# Altium footprint library PcbLib_jp.PcbLib: 178 footprints (part 4 of 12)
Each footprint in its own frame and in the unit in brackets; x right, y up, seen from the top. Pads: shape width x height; smd on the part's side, far side on the other; paste and mask are expansions set on the pad; w line width, h text height; cw(c..) or ccw(c..) is an arc to the next point about the centre after c.
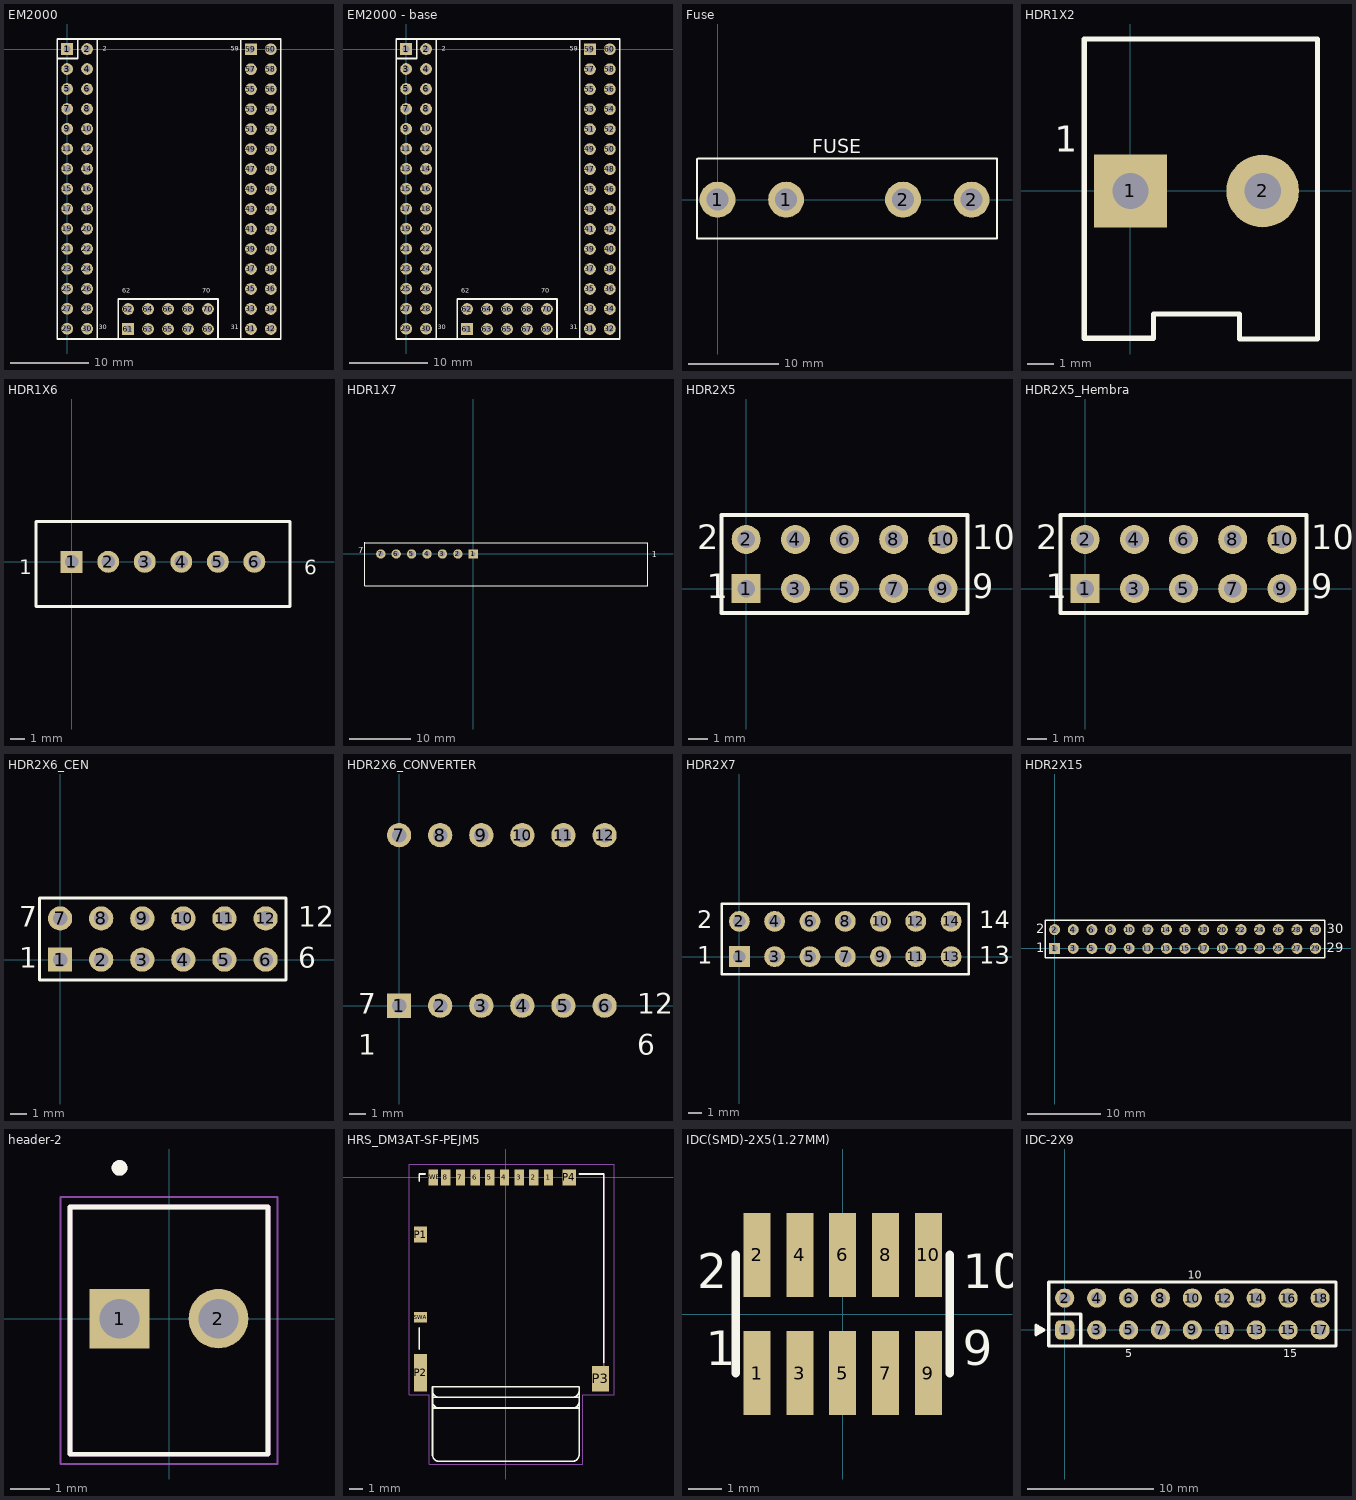
[diagram p3: the footprints below, top view; thin cyan lines are the x and y axes]

## EM2000 [mm] "TIBBO"
pads (70):
  rect 1.5x1.5 hole 0.9: 1(0,0) 59(23.368,-0.025) 61(7.753,-35.595)
  round 1.5 hole 0.9: 2(2.54,0) 3(0,-2.54) 4(2.54,-2.54) 5(0,-5.08) 6(2.54,-5.08) 7(0,-7.62) 8(2.54,-7.62) 9(0,-10.16) 10(2.54,-10.16) 11(0,-12.7) 12(2.54,-12.7) 13(0,-15.24) 14(2.54,-15.24) 15(0,-17.78) 16(2.54,-17.78) 17(0,-20.32) 18(2.54,-20.32) 19(0,-22.86) 20(2.54,-22.86) 21(0,-25.4) 22(2.54,-25.4) 23(0,-27.94) 24(2.54,-27.94) 25(0,-30.48) 26(2.54,-30.48) 27(0,-33.02) 28(2.54,-33.02) 29(0,-35.56) 30(2.54,-35.56) 31(23.368,-35.585) 32(25.908,-35.585) 33(23.368,-33.045) 34(25.908,-33.045) 35(23.368,-30.505) 36(25.908,-30.505) 37(23.368,-27.965) 38(25.908,-27.965) 39(23.368,-25.425) 40(25.908,-25.425) 41(23.368,-22.885) 42(25.908,-22.885) 43(23.368,-20.345) 44(25.908,-20.345) 45(23.368,-17.805) 46(25.908,-17.805) 47(23.368,-15.265) 48(25.908,-15.265) 49(23.368,-12.725) 50(25.908,-12.725) 51(23.368,-10.185) 52(25.908,-10.185) 53(23.368,-7.645) 54(25.908,-7.645) 55(23.368,-5.105) 56(25.908,-5.105) 57(23.368,-2.565) 58(25.908,-2.565) 60(25.908,-0.025) 62(7.753,-33.055) 63(10.293,-35.595) 64(10.293,-33.055) 65(12.833,-35.595) 66(12.833,-33.055) 67(15.373,-35.595) 68(15.373,-33.055) 69(17.913,-35.595) 70(17.913,-33.055)
Top Overlay:
  lines w0.2: 3.81,1.27 -1.27,1.27 -1.27,-36.83 3.81,-36.83 3.81,1.274 ; 6.559,1.235 19.259,1.235 ; 6.483,-36.865 19.183,-36.865 19.183,-31.785 6.483,-31.785 6.483,-36.865 ; 22.098,-36.855 27.178,-36.855 27.178,1.274 22.098,1.274 22.098,-36.855
  lines w0.203: -1.249,-36.866 27.151,-36.866 ; -1.249,-1.205 1.367,-1.205 1.367,1.259 ; 3.81,1.274 22.098,1.274
  text "62" at 7.035,-31.166 h1
  text "70" at 17.205,-31.166 h1
  text "30" at 4.025,-35.846 h1
  text "2" at 4.514,-0.407 h1
  text "31" at 20.775,-35.846 h1
  text "59" at 20.775,-0.396 h1
3D body "Tibbo Technology Inc-EM1000.step": height 10.5, standoff -1.1, extent -0.94,-36.59 27,1.51

## EM2000 - base [mm] "TIBBO"
pads (70):
  rect 1.5x1.5 hole 0.9: 1(0,0) 59(23.368,-0.025) 61(7.753,-35.595)
  round 1.5 hole 0.9: 2(2.54,0) 3(0,-2.54) 4(2.54,-2.54) 5(0,-5.08) 6(2.54,-5.08) 7(0,-7.62) 8(2.54,-7.62) 9(0,-10.16) 10(2.54,-10.16) 11(0,-12.7) 12(2.54,-12.7) 13(0,-15.24) 14(2.54,-15.24) 15(0,-17.78) 16(2.54,-17.78) 17(0,-20.32) 18(2.54,-20.32) 19(0,-22.86) 20(2.54,-22.86) 21(0,-25.4) 22(2.54,-25.4) 23(0,-27.94) 24(2.54,-27.94) 25(0,-30.48) 26(2.54,-30.48) 27(0,-33.02) 28(2.54,-33.02) 29(0,-35.56) 30(2.54,-35.56) 31(23.368,-35.585) 32(25.908,-35.585) 33(23.368,-33.045) 34(25.908,-33.045) 35(23.368,-30.505) 36(25.908,-30.505) 37(23.368,-27.965) 38(25.908,-27.965) 39(23.368,-25.425) 40(25.908,-25.425) 41(23.368,-22.885) 42(25.908,-22.885) 43(23.368,-20.345) 44(25.908,-20.345) 45(23.368,-17.805) 46(25.908,-17.805) 47(23.368,-15.265) 48(25.908,-15.265) 49(23.368,-12.725) 50(25.908,-12.725) 51(23.368,-10.185) 52(25.908,-10.185) 53(23.368,-7.645) 54(25.908,-7.645) 55(23.368,-5.105) 56(25.908,-5.105) 57(23.368,-2.565) 58(25.908,-2.565) 60(25.908,-0.025) 62(7.753,-33.055) 63(10.293,-35.595) 64(10.293,-33.055) 65(12.833,-35.595) 66(12.833,-33.055) 67(15.373,-35.595) 68(15.373,-33.055) 69(17.913,-35.595) 70(17.913,-33.055)
Top Overlay:
  lines w0.2: 3.81,1.27 -1.27,1.27 -1.27,-36.83 3.81,-36.83 3.81,1.274 ; 6.559,1.235 19.259,1.235 ; 6.483,-36.865 6.483,-31.785 19.183,-31.785 19.183,-36.865 6.483,-36.865 ; 22.098,-36.855 22.098,1.274 27.178,1.274 27.178,-36.855 22.098,-36.855
  lines w0.203: -1.249,-36.866 27.151,-36.866 ; -1.249,-1.205 1.367,-1.205 1.367,1.259 ; 3.81,1.274 22.098,1.274
  text "59" at 20.775,-0.396 h1
  text "31" at 20.775,-35.846 h1
  text "2" at 4.514,-0.407 h1
  text "30" at 4.025,-35.846 h1
  text "70" at 17.205,-31.166 h1
  text "62" at 7.035,-31.166 h1

## Fuse [mm]
pads (4):
  round 4 hole 2.43: 1(0,0) 1(7.62,0) 2(20.62,0) 2(28.24,0)
Top Overlay:
  lines w0.254: -2.286,4.482 -2.286,-4.318 31.064,-4.318 31.064,4.445 ; -2.159,4.572 31.064,4.572
  text "FUSE" at 10.516,5.156 h1.52
3D body "CircuitWorks-FUSE.STEP": height 13.84, standoff 0.99, extent -0.301,-2.749 30.579,3.156
3D body: height 1.31, standoff -1.31, extent 25.908,11.684 25.908,11.684

## HDR1X2 [mil] "Connector; Header; 2 Position"
pads (2):
  rect 110x110 hole 55: 1(0,0)
  round 110 hole 55: 2(200,0)
Top Overlay:
  lines w7.87: -70,-223 35,-223 35,-186.1 165,-186.1 165,-224 283,-224 283,230 -70,230 -70,-223
  text "1" at -115,59 h39.37
3D body "010321021.stp": height 584.65, standoff -102.36, extent -73.74,-219.92 283.74,228.9

## HDR1X6 [mm] "Connector; Header; 6 Position"
pads (6):
  rect 1.5x1.5 hole 0.9: 1(0,0)
  round 1.5 hole 0.9: 2(2.5,0) 3(5,0) 4(7.5,0) 5(10,0) 6(12.5,0)
Top Overlay:
  lines w0.2: -2.449,-3.045 14.95,-3.045 14.95,2.747 -2.449,2.747 -2.449,-3.045
  text "1" at -3.607,-0.864 h1
  text "6" at 15.926,-0.889 h1
3D body "User Library-molex kk 0_1in latching 6 way vertical header.STEP": height 2.64, standoff -12.6, extent -1.321,-2.87 13.919,2.972

## HDR1X7 [mm] "Connector; Header; 6 Position"
pads (7):
  rect 1.524x1.524 hole 0.762: 1(0,0)
  round 1.5 hole 0.9: 2(-2.5,0) 3(-5,0) 4(-7.5,0) 5(-10,0) 6(-12.5,0) 7(-15,0)
Top Overlay:
  lines w0.2: -17.576,1.858 28.332,1.858 28.332,-5.127 -17.576,-5.127 -17.576,1.873
  text "7" at -18.694,0.127 h1
  text "1" at 28.956,-0.559 h1
3D body "User Library-RF receviver.STEP": height 14.7, standoff -1.7, extent -17.591,-4.827 28.129,1.423

## HDR2X5 [mm] "Connector; Header; 5x2 Position"
pads (10):
  rect 1.5x1.5 hole 0.9: 1(0,0)
  round 1.5 hole 0.9: 2(0,2.54) 3(2.54,0) 4(2.54,2.54) 5(5.08,0) 6(5.08,2.54) 7(7.62,0) 8(7.62,2.54) 9(10.16,0) 10(10.16,2.54)
Top Overlay:
  lines w0.2: -1.27,-1.27 -1.27,3.81 11.43,3.81 11.43,-1.27 -1.27,-1.27
  text "2" at -2.54,2.032 h1.27
  text "1" at -2.032,-0.508 h1.27
  text "9" at 11.684,-0.508 h1.27
  text "10" at 11.684,2.032 h1.27
3D body "DS1021-2_5SF11--3DModel-STEP-56544.STEP": height 8.6, standoff -3, extent -1.21,-1.23 11.49,3.85

## HDR2X5_Hembra [mm] "Connector; Header; 5x2 Position"
pads (10):
  rect 1.5x1.5 hole 0.9: 1(0,0)
  round 1.5 hole 0.9: 2(0,2.54) 3(2.54,0) 4(2.54,2.54) 5(5.08,0) 6(5.08,2.54) 7(7.62,0) 8(7.62,2.54) 9(10.16,0) 10(10.16,2.54)
Top Overlay:
  lines w0.2: -1.27,-1.27 11.43,-1.27 11.43,3.81 -1.27,3.81 -1.27,-1.27
  text "10" at 11.684,2.032 h1.27
  text "9" at 11.684,-0.508 h1.27
  text "1" at -2.032,-0.508 h1.27
  text "2" at -2.54,2.032 h1.27
3D body "PPTC052LFBN-RC--3DModel-STEP-269445.STEP": height 8.51, standoff -3.4, extent -1.404,-1.22 11.804,3.86

## HDR2X6_CEN [mm] "Connector; Header; 6x2 Position"
pads (12):
  rect 1.5x1.5 hole 0.9: 1(0,0)
  round 1.5 hole 0.9: 2(2.54,0) 3(5.08,0) 4(7.62,0) 5(10.16,0) 6(12.7,0) 7(0,2.54) 8(2.54,2.54) 9(5.08,2.54) 10(7.62,2.54) 11(10.16,2.54) 12(12.7,2.54)
Top Overlay:
  lines w0.2: -1.27,-1.27 13.97,-1.27 13.97,3.81 -1.27,3.81 -1.27,-1.27
  text "12" at 14.732,2.032 h1.27
  text "6" at 14.732,-0.508 h1.27
  text "1" at -2.54,-0.508 h1.27
  text "7" at -2.54,2.032 h1.27

## HDR2X6_CONVERTER [mm] "Arduino Level Convertr"
pads (12):
  rect 1.5x1.5 hole 0.9 square: 1(0,0)
  round 1.5 hole 0.9: 2(2.54,0) 3(5.08,0) 4(7.62,0) 5(10.16,0) 6(12.7,0) 7(0,10.541) 8(2.54,10.541) 9(5.08,10.541) 10(7.62,10.541) 11(10.16,10.541) 12(12.7,10.541)
Top Overlay:
  text "7" at -2.54,-0.508 h1.27
  text "1" at -2.54,-3.048 h1.27
  text "6" at 14.732,-3.048 h1.27
  text "12" at 14.732,-0.508 h1.27
3D body "User Library-LEVEL_CONVERTER_ADAFRUIT.STEP": height 5.46, standoff -6.29, extent -3.912,-2.311 16.538,12.929

## HDR2X7 [mm] "Connector; Header; 7x2 Position"
pads (14):
  rect 1.5x1.5 hole 0.9: 1(0,0)
  round 1.5 hole 0.9: 2(0,2.54) 3(2.54,0) 4(2.54,2.54) 5(5.08,0) 6(5.08,2.54) 7(7.62,0) 8(7.62,2.54) 9(10.16,0) 10(10.16,2.54) 11(12.7,0) 12(12.7,2.54) 13(15.24,0) 14(15.24,2.54)
Top Overlay:
  lines w0.2: -1.27,-1.27 -1.27,3.81 16.51,3.81 16.51,-1.27 -1.27,-1.27
  text "2" at -3.048,2.032 h1.27
  text "1" at -3.048,-0.508 h1.27
  text "14" at 17.272,2.032 h1.27
  text "13" at 17.272,-0.508 h1.27
3D body "42k6788_2-1761603-5.stp": height 10, standoff -1.81, extent -5,-3.11 20.4,6.11

## HDR2X15 [mm] "Connector; Header; 15x2 Position"
pads (30):
  rect 1.5x1.5 hole 0.9: 1(0,0)
  round 1.5 hole 0.9: 2(0,2.54) 3(2.54,0) 4(2.54,2.54) 5(5.08,0) 6(5.08,2.54) 7(7.62,0) 8(7.62,2.54) 9(10.16,0) 10(10.16,2.54) 11(12.7,0) 12(12.7,2.54) 13(15.24,0) 14(15.24,2.54) 15(17.78,0) 16(17.78,2.54) 17(20.32,0) 18(20.32,2.54) 19(22.86,0) 20(22.86,2.54) 21(25.4,0) 22(25.4,2.54) 23(27.94,0) 24(27.94,2.54) 25(30.48,0) 26(30.48,2.54) 27(33.02,0) 28(33.02,2.54) 29(35.56,0) 30(35.56,2.54)
Top Overlay:
  lines w0.2: -1.27,-1.27 -1.27,3.81 36.83,3.81 36.83,-1.27 -1.27,-1.27
  text "30" at 37.084,2.032 h1.27
  text "29" at 37.084,-0.508 h1.27
  text "2" at -2.54,2.032 h1.27
  text "1" at -2.54,-0.508 h1.27
3D body "PPPC152LFBN-RC--3DModel-STEP-56544.STEP": height 8.51, standoff -3.4, extent -1.53,-1.26 37.078,3.82

## header-2 [mm]
pads (2):
  rect 1.53x1.53 hole 1.02: 1(-1.27,0)
  round 1.53 hole 1.02: 2(1.27,0)
Top Overlay:
  circle w0.2: c-1.27,3.87 r0.1
  lines w0.127: -2.54,-3.48 2.54,-3.48 2.54,2.87 -2.54,2.87 -2.54,-3.48
Mechanical 13:
  circle w0.2: c-1.27,3.87 r0.1
  lines w0.127: -2.54,-3.48 2.54,-3.48 2.54,2.87 -2.54,2.87 -2.54,-3.48
Mechanical 15:
  lines w0.05: -2.79,-3.73 2.79,-3.73 2.79,3.12 -2.79,3.12 -2.79,-3.73
3D body "3-647295-2.stp": height 10.37, standoff -3.6, extent -2.642,-3.404 2.438,2.946

## HRS_DM3AT-SF-PEJM5 [mm]
pads (14):
  rect 0.7x1.2 smd: 1(3.2,0) 2(2.1,0) 3(1,0) 4(-0.1,0) 5(-1.2,0) 6(-2.3,0) 7(-3.4,0) 8(-4.5,0) SWB(-5.45,0)
  rect 1x1.2 smd: P1(-6.4,-4.3) P4(4.75,0)
  rect 1x2.8 smd: P2(-6.4,-14.65)
  rect 1.3x1.9 smd: P3(7.1,-15.1)
  rect 1x0.8 smd: SWA(-6.4,-10.5)
Top Overlay:
  lines w0.127: -6.5,-12.9 -6.5,-11.3 ; -6.5,-0.3 -6.5,0.25 -6.05,0.25 ; 5.5,0.25 7.35,0.25 7.35,-13.9 ; -5.5,-17.3 -5,-17.3 ; -5.5,-17.3 -5.5,-16.8 ; -5.5,-17.3 -5.5,-20.8 ccw(c-5,-20.8) -5,-21.3 5,-21.3 ccw(c5,-20.8) 5.5,-20.8 5.5,-17.3 ; -5.5,-16.8 ccw(c-5,-16.8) -5,-17.3 ; -5.5,-16.8 -5.5,-16.5 ; -5.5,-16.5 -5,-16.5 ; -5.5,-16.5 -5.5,-16 ; -5.5,-16 ccw(c-5,-16) -5,-16.5 ; -5.5,-16 -5.5,-15.7 5.5,-15.7 5.5,-16 ; -5,-17.3 5,-17.3 ; -5,-16.5 5,-16.5 ; 5,-17.3 ccw(c5,-16.8) 5.5,-16.8 ; 5,-17.3 5.5,-17.3 ; 5,-16.5 ccw(c5,-16) 5.5,-16 ; 5,-16.5 5.5,-16.5 ; 5.5,-17.3 5.5,-16.8 ; 5.5,-16.8 5.5,-16.5 ; 5.5,-16.5 5.5,-16
Mechanical 13:
  lines w0.127: 7.35,-15.7 7.35,0.25
  text "PCB Edge" at -4.758,-15.525 h0.61
Mechanical 15:
  lines w0.05: -7.25,-16.3 -5.75,-16.3 -5.75,-21.5 5.75,-21.5 5.75,-16.3 8.125,-16.3 8.125,1 -7.25,1 -7.25,-16.3
3D body "DM3AT-SF-PEJM5.stp": height 1.84, standoff 0.16, extent -6.441,-15.949 7.508,0.201

## IDC(SMD)-2X5(1.27MM) [mm]
height 3.9
pads (10):
  rect 0.8x2.5 smd: 1(-2.54,-1.75) 2(-2.54,1.75) 3(-1.27,-1.75) 4(-1.27,1.75) 5(0,-1.75) 6(0,1.75) 7(1.27,-1.75) 8(1.27,1.75) 9(2.54,-1.75) 10(2.54,1.75)
Top Overlay:
  lines w0.254: -3.175,-1.75 -3.175,1.75 ; 3.175,-1.75 3.175,1.75
  text "1" at -4.064,-1.524 h1.02
  text "2" at -4.318,0.762 h1.02
  text "9" at 3.556,-1.524 h1.02
  text "10" at 3.556,0.762 h1.02
3D body "User Library-RM127_10pin_Header.STEP": height 4.46, standoff -0.04, extent -3.175,-2.75 3.175,2.75

## IDC-2X9 [mil]
height 153.54
pads (18):
  rrect50% 60x60 hole 36: 1(0,0)
  round 60 hole 36: 2(0,100) 3(100,0) 4(100,100) 5(200,0) 6(200,100) 7(300,0) 8(300,100) 9(400,0) 10(400,100) 11(500,0) 12(500,100) 13(600,0) 14(600,100) 15(700,0) 16(700,100) 17(800,0) 18(800,100)
Top Overlay:
  lines w10: -75,6 -85,-12 -85,12 -90,15 ; -50,50 50,50 50,-50 ; -90,15 -90,-15 -65,0 -90,15 ; -50,-50 850,-50 850,150 -50,150 -50,-50
  text "15" at 685,-85 h25
  text "5" at 190,-85 h25
  text "10" at 385,160 h25
Bottom Overlay:
  circle w8: c0,0 r39.37
3D body "TPH03-9.STEP": height 336.22, standoff -116.54, extent -48.23,-48.82 851.77,151.18